# Altium footprint library FootprintLib.PcbLib: 19 footprints (part 1 of 2)
Each footprint in its own frame and in the unit in brackets; x right, y up, seen from the top. Pads: shape width x height; smd on the part's side, far side on the other; paste and mask are expansions set on the pad; w line width, h text height; cw(c..) or ccw(c..) is an arc to the next point about the centre after c.
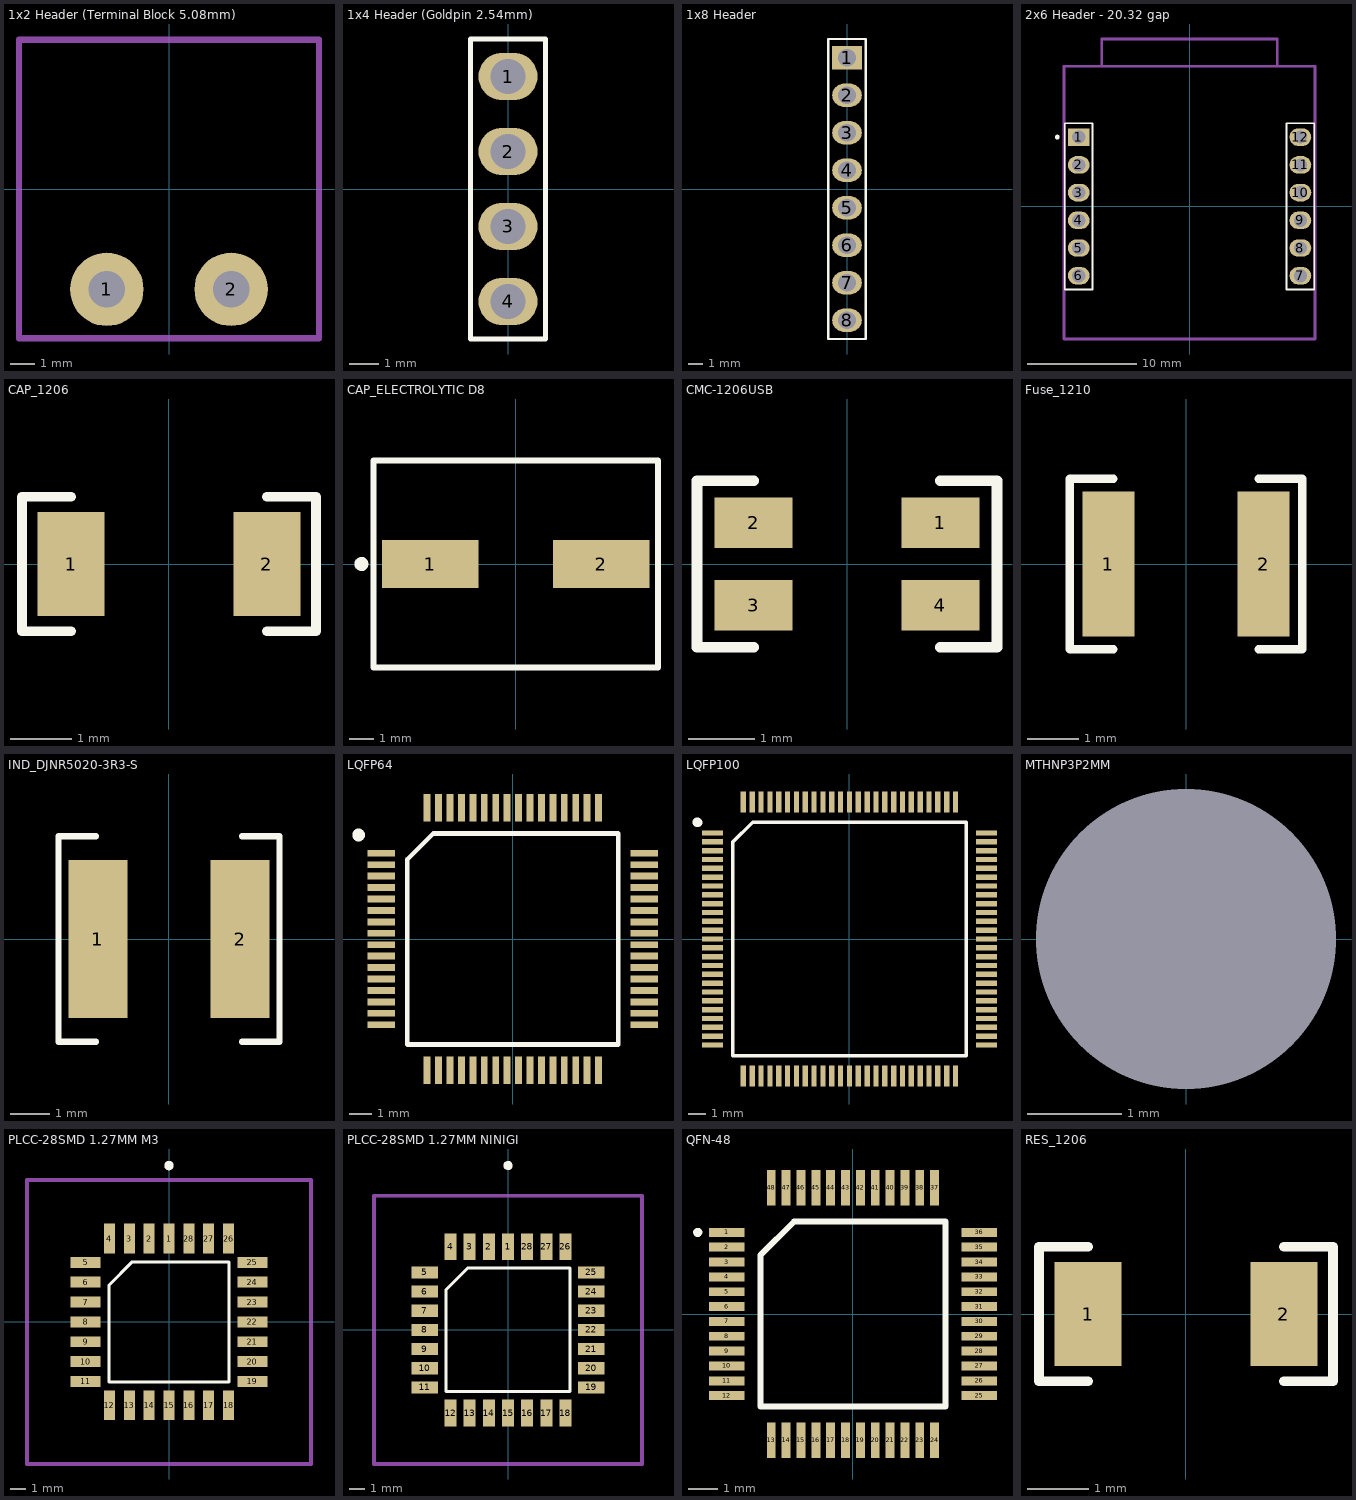
[diagram p0: the footprints below, top view; thin cyan lines are the x and y axes]

## 1x2 Header (Terminal Block 5.08mm) [mm] "1x2 Header (Terminal Block 5.08mm)"
pads (2):
  round 3 hole 1.5: 1(-2.54,-4.1) 2(2.54,-4.1)
Mechanical 1:
  lines w0.254: -6.13,-6.1 6.13,-6.1 6.13,6.1 -6.13,6.1 -6.13,-6.1
3D body "2059783_796638-2.SLDPRT": height 8.5, standoff -3.35, extent -5.99,-6 5.99,6

## 1x4 Header (Goldpin 2.54mm) [mm] "1x4 Header (Goldpin 2.54mm)"
pads (4):
  oval 2x1.6 hole 1.2: 1(0,3.81) 2(0,1.27) 3(0,-1.27) 4(0,-3.81)
Top Overlay:
  lines w0.16: -1.27,-5.08 -1.27,5.08 1.27,5.08 1.27,-5.08 -1.27,-5.08
3D body "User Library-1x2 TH Pitch 2_54mm.SLDPRT": height 9.5, standoff -3.2, extent -1.27,-5.08 1.27,0
3D body "User Library-1x2 TH Pitch 2_54mm.SLDPRT": height 9.5, standoff -3.2, extent -1.27,0 1.27,5.08

## 1x8 Header [mm]
pads (8):
  rect 2x1.6 hole 1.2: 1(0,8.89)
  oval 2x1.6 hole 1.2: 2(0,6.35) 3(0,3.81) 4(0,1.27) 5(0,-1.27) 6(0,-3.81) 7(0,-6.35) 8(0,-8.89)
Top Overlay:
  lines w0.16: -1.27,-10.16 1.27,-10.16 1.27,10.16 -1.27,10.16 -1.27,-10.16
3D body "User Library-Pin header 1x8 pinos reto pitch 2_54.SLDPRT": height 9.5, standoff -3.2, extent -1.23,-10.25 1.31,10.07

## 2x6 Header - 20.32 gap [mm]
pads (12):
  rect 2x1.6 hole 1.2: 1(-10.16,6.35)
  oval 2x1.6 hole 1.2: 2(-10.16,3.81) 3(-10.16,1.27) 4(-10.16,-1.27) 5(-10.16,-3.81) 6(-10.16,-6.35) 7(10.16,-6.35) 8(10.16,-3.81) 9(10.16,-1.27) 10(10.16,1.27) 11(10.16,3.81) 12(10.16,6.35)
Top Overlay:
  circle w0.4: c-12.125,6.35 r0.025
  lines w0.16: -11.43,-7.62 -11.43,7.62 -8.89,7.62 -8.89,-7.62 -11.43,-7.62 ; 8.89,-7.62 8.89,7.62 11.43,7.62 11.43,-7.62 8.89,-7.62
Mechanical 2:
  lines w0.254: -8.05,12.85 -8.05,15.35 8.05,15.35 8.05,12.85 ; -11.5,-12.15 11.5,-12.15 11.5,12.85 -11.5,12.85 -11.5,-12.15
3D body "WIZ820IO--3DModel-STEP-56544.STEP": height 19.61, standoff -6.1, extent -11.5,-12.15 11.5,15.35
3D body: height 0.25, standoff 0, extent 8.83,-7.9 11.37,7.84
3D body "User Library-Header_Fem_1X6.SLDPRT": height 8.5, standoff -3.2, extent -11.37,-7.9 -8.83,7.84

## CAP_1206 [mm]
pads (2):
  rect 1.1x1.7 smd: 1(-1.6,0) 2(1.6,0)
Top Overlay:
  lines w0.16: -1.6,-1.1 -2.4,-1.1 -2.4,1.1 -1.6,1.1 ; 1.6,-1.1 2.4,-1.1 2.4,1.1 1.6,1.1
3D body "CircuitWorks-CAPACITOR 1206.SLDPRT": height 1.63, standoff -0.03, extent -1.6,-0.78 1.6,0.78

## CAP_ELECTROLYTIC D8 [mm]
pads (2):
  rect 4x2 smd: 1(-3.55,0) 2(3.55,0)
Top Overlay:
  circle w0.3: c-6.4,0 r0.141
  lines w0.254: -5.9,-4.3 -5.9,4.3 5.9,4.3 5.9,-4.3 -5.9,-4.3
3D body "User Library-SMD 8x10.SLDPRT": height 8.5, standoff 0, extent -4.85,-4.15 4.85,4.15

## CMC-1206USB [mm]
pads (4):
  rect 1.17x0.76 smd: 1(1.4,0.62) 2(-1.4,0.62) 3(-1.4,-0.62) 4(1.4,-0.62)
Top Overlay:
  lines w0.16: -1.4,-1.25 -2.25,-1.25 -2.25,1.25 -1.4,1.25 ; 1.4,-1.25 2.25,-1.25 2.25,1.25 1.4,1.25
3D body "Coilcraft-1206USB.SLDPRT": height 1.93, standoff 0, extent -1.66,-0.86 1.66,0.86

## Fuse_1210 [mm] "Fuse 0ZCH0050FF2G 500mA 16V"
pads (2):
  rect 1x2.8 smd: 1(-1.5,0) 2(1.5,0)
Top Overlay:
  lines w0.16: -1.4,-1.65 -1.625,-1.65 -2.075,-1.65 -2.25,-1.65 -2.25,1.65 -1.4,1.65 ; 1.4,-1.65 2.25,-1.65 2.25,1.65 2.075,1.65 1.625,1.65 1.4,1.65
3D body "User Library-0ZCH0005FF2E.SLDPRT": height 0.71, standoff 0.01, extent -1.7,-1.3 1.7,1.3

## IND_DJNR5020-3R3-S [mm]
pads (2):
  rect 1.5x4 smd: 1(-1.8,0) 2(1.8,0)
Top Overlay:
  lines w0.16: -1.85,-2.6 -2.8,-2.6 -2.8,0 -2.8,2.6 -1.85,2.6 ; 1.85,-2.6 2.8,-2.6 2.8,0 2.8,2.6 1.85,2.6
3D body "User Library-CDRH4D28.SLDPRT": height 2.9, standoff -0.01, extent -2.45,-2.45 2.45,2.45

## LQFP64 [mm]
pads (64):
  rect 1.2x0.3 smd mask+0.05: 1(-5.75,3.75) 2(-5.75,3.25) 3(-5.75,2.75) 4(-5.75,2.25) 5(-5.75,1.75) 6(-5.75,1.25) 7(-5.75,0.75) 8(-5.75,0.25) 9(-5.75,-0.25) 10(-5.75,-0.75) 11(-5.75,-1.25) 12(-5.75,-1.75) 13(-5.75,-2.25) 14(-5.75,-2.75) 15(-5.75,-3.25) 16(-5.75,-3.75) 33(5.75,-3.75) 34(5.75,-3.25) 35(5.75,-2.75) 36(5.75,-2.25) 37(5.75,-1.75) 38(5.75,-1.25) 39(5.75,-0.75) 40(5.75,-0.25) 41(5.75,0.25) 42(5.75,0.75) 43(5.75,1.25) 44(5.75,1.75) 45(5.75,2.25) 46(5.75,2.75) 47(5.75,3.25) 48(5.75,3.75)
  rect 0.3x1.2 smd mask+0.05: 17(-3.75,-5.75) 18(-3.25,-5.75) 19(-2.75,-5.75) 20(-2.25,-5.75) 21(-1.75,-5.75) 22(-1.25,-5.75) 23(-0.75,-5.75) 24(-0.25,-5.75) 25(0.25,-5.75) 26(0.75,-5.75) 27(1.25,-5.75) 28(1.75,-5.75) 29(2.25,-5.75) 30(2.75,-5.75) 31(3.25,-5.75) 32(3.75,-5.75) 49(3.75,5.75) 50(3.25,5.75) 51(2.75,5.75) 52(2.25,5.75) 53(1.75,5.75) 54(1.25,5.75) 55(0.75,5.75) 56(0.25,5.75) 57(-0.25,5.75) 58(-0.75,5.75) 59(-1.25,5.75) 60(-1.75,5.75) 61(-2.25,5.75) 62(-2.75,5.75) 63(-3.25,5.75) 64(-3.75,5.75)
Top Overlay:
  circle w0.5: c-6.75,4.55 r0.025
  lines w0.2: -4.615,-4.615 4.615,-4.615 4.615,4.615 -3.48,4.615 -4.615,3.48 -4.615,-4.615
3D body "User Library-STM32Fxxx -LQFP64 10mm x 10mm.SLDPRT": height 1.6, standoff 0.01, extent -5.999,-5.999 5.999,5.999

## LQFP100 [mm] "LQFP100"
pads (100):
  rect 1.2x0.3 smd mask+0.05: 1(-7.75,6) 2(-7.75,5.5) 3(-7.75,5) 4(-7.75,4.5) 5(-7.75,4) 6(-7.75,3.5) 7(-7.75,3) 8(-7.75,2.5) 9(-7.75,2) 10(-7.75,1.5) 11(-7.75,1) 12(-7.75,0.5) 13(-7.75,0) 14(-7.75,-0.5) 15(-7.75,-1) 16(-7.75,-1.5) 17(-7.75,-2) 18(-7.75,-2.5) 19(-7.75,-3) 20(-7.75,-3.5) 21(-7.75,-4) 22(-7.75,-4.5) 23(-7.75,-5) 24(-7.75,-5.5) 25(-7.75,-6) 51(7.75,-6) 52(7.75,-5.5) 53(7.75,-5) 54(7.75,-4.5) 55(7.75,-4) 56(7.75,-3.5) 57(7.75,-3) 58(7.75,-2.5) 59(7.75,-2) 60(7.75,-1.5) 61(7.75,-1) 62(7.75,-0.5) 63(7.75,0) 64(7.75,0.5) 65(7.75,1) 66(7.75,1.5) 67(7.75,2) 68(7.75,2.5) 69(7.75,3) 70(7.75,3.5) 71(7.75,4) 72(7.75,4.5) 73(7.75,5) 74(7.75,5.5) 75(7.75,6)
  rect 0.3x1.2 smd mask+0.05: 26(-6,-7.75) 27(-5.5,-7.75) 28(-5,-7.75) 29(-4.5,-7.75) 30(-4,-7.75) 31(-3.5,-7.75) 32(-3,-7.75) 33(-2.5,-7.75) 34(-2,-7.75) 35(-1.5,-7.75) 36(-1,-7.75) 37(-0.5,-7.75) 38(0,-7.75) 39(0.5,-7.75) 40(1,-7.75) 41(1.5,-7.75) 42(2,-7.75) 43(2.5,-7.75) 44(3,-7.75) 45(3.5,-7.75) 46(4,-7.75) 47(4.5,-7.75) 48(5,-7.75) 49(5.5,-7.75) 50(6,-7.75) 76(6,7.75) 77(5.5,7.75) 78(5,7.75) 79(4.5,7.75) 80(4,7.75) 81(3.5,7.75) 82(3,7.75) 83(2.5,7.75) 84(2,7.75) 85(1.5,7.75) 86(1,7.75) 87(0.5,7.75) 88(0,7.75) 89(-0.5,7.75) 90(-1,7.75) 91(-1.5,7.75) 92(-2,7.75) 93(-2.5,7.75) 94(-3,7.75) 95(-3.5,7.75) 96(-4,7.75) 97(-4.5,7.75) 98(-5,7.75) 99(-5.5,7.75) 100(-6,7.75)
Top Overlay:
  circle w0.5: c-8.6,6.6 r0.025
  lines w0.2: -6.615,-6.615 6.615,-6.615 6.615,6.615 -5.48,6.615 -6.615,5.48 -6.615,-6.615
3D body "User Library-LQFP100_05.SLDPRT": height 1.6, standoff 0, extent -8,-8 8,8

## MTHNP3P2MM [mm] "Mounting Hole Non-Plated, 3.2mm hole"
pads (1):
  round 1 hole 3.2: ""(0,0)

## PLCC-28SMD 1.27MM M3 [mm] "PLCC-28SMD 1.27MM M3"
pads (28):
  rect 0.7x1.91 smd: 1(0,5.33) 2(-1.27,5.33) 3(-2.54,5.33) 4(-3.81,5.33) 12(-3.81,-5.33) 13(-2.54,-5.33) 14(-1.27,-5.33) 15(0,-5.33) 16(1.27,-5.33) 17(2.54,-5.33) 18(3.81,-5.33) 26(3.81,5.33) 27(2.54,5.33) 28(1.27,5.33)
  rect 1.91x0.7 smd: 5(-5.33,3.81) 6(-5.33,2.54) 7(-5.33,1.27) 8(-5.33,0) 9(-5.33,-1.27) 10(-5.33,-2.54) 11(-5.33,-3.81) 19(5.33,-3.81) 20(5.33,-2.54) 21(5.33,-1.27) 22(5.33,0) 23(5.33,1.27) 24(5.33,2.54) 25(5.33,3.81)
Top Overlay:
  circle w0.4: c0,10 r0.1
  lines w0.2: -3.84,-3.84 -3.84,2.35 -2.35,3.84 3.84,3.84 3.84,-3.84 -3.84,-3.84
Mechanical 2:
  lines w0.254: -9.09,-9.09 -9.09,9.09 9.09,9.09 9.09,-9.09 -9.09,-9.09
3D body "PLCC-28SMD.SLDPRT": height 4.6, standoff -1.05, extent -8.67,-8.67 8.67,8.67

## PLCC-28SMD 1.27MM NINIGI [mm] "PLCC-28SMD 1.27MM NINIGI"
pads (28):
  rect 0.8x1.76 smd: 1(0,5.51) 2(-1.27,5.51) 3(-2.54,5.51) 4(-3.81,5.51) 12(-3.81,-5.51) 13(-2.54,-5.51) 14(-1.27,-5.51) 15(0,-5.51) 16(1.27,-5.51) 17(2.54,-5.51) 18(3.81,-5.51) 26(3.81,5.51) 27(2.54,5.51) 28(1.27,5.51)
  rect 1.76x0.8 smd: 5(-5.51,3.81) 6(-5.51,2.54) 7(-5.51,1.27) 8(-5.51,0) 9(-5.51,-1.27) 10(-5.51,-2.54) 11(-5.51,-3.81) 19(5.51,-3.81) 20(5.51,-2.54) 21(5.51,-1.27) 22(5.51,0) 23(5.51,1.27) 24(5.51,2.54) 25(5.51,3.81)
Top Overlay:
  circle w0.4: c0,10.9 r0.1
  lines w0.2: -4.095,-4.095 -4.095,2.68 -2.68,4.095 4.095,4.095 4.095,-4.095 -4.095,-4.095
Mechanical 2:
  lines w0.254: -8.89,-8.89 8.89,-8.89 8.89,8.89 -8.89,8.89 -8.89,-8.89
3D body "540-88-028-17-400.SLDPRT": height 4.6, standoff -1.05, extent -8.67,-8.67 8.67,8.67

## QFN-48 [mm]
pads (48):
  rect 1.2x0.3 smd mask+0.05: 1(-4.25,2.75) 2(-4.25,2.25) 3(-4.25,1.75) 4(-4.25,1.25) 5(-4.25,0.75) 6(-4.25,0.25) 7(-4.25,-0.25) 8(-4.25,-0.75) 9(-4.25,-1.25) 10(-4.25,-1.75) 11(-4.25,-2.25) 12(-4.25,-2.75) 25(4.25,-2.75) 26(4.25,-2.25) 27(4.25,-1.75) 28(4.25,-1.25) 29(4.25,-0.75) 30(4.25,-0.25) 31(4.25,0.25) 32(4.25,0.75) 33(4.25,1.25) 34(4.25,1.75) 35(4.25,2.25) 36(4.25,2.75)
  rect 0.3x1.2 smd mask+0.05: 13(-2.75,-4.25) 14(-2.25,-4.25) 15(-1.75,-4.25) 16(-1.25,-4.25) 17(-0.75,-4.25) 18(-0.25,-4.25) 19(0.25,-4.25) 20(0.75,-4.25) 21(1.25,-4.25) 22(1.75,-4.25) 23(2.25,-4.25) 24(2.75,-4.25) 37(2.75,4.25) 38(2.25,4.25) 39(1.75,4.25) 40(1.25,4.25) 41(0.75,4.25) 42(0.25,4.25) 43(-0.25,4.25) 44(-0.75,4.25) 45(-1.25,4.25) 46(-1.75,4.25) 47(-2.25,4.25) 48(-2.75,4.25)
Top Overlay:
  circle w0.254: c-5.225,2.75 r0.025
  lines w0.2: -3.115,-3.115 -3.115,1.98 -1.98,3.115 3.115,3.115 3.115,-3.115 -3.115,-3.115
3D body "User Library-LQFP48-3.SLDPRT": height 1.6, standoff 0, extent -4.5,-4.5 4.5,4.5

## RES_1206 [mm]
pads (2):
  rect 1.1x1.7 smd: 1(-1.6,0) 2(1.6,0)
Top Overlay:
  lines w0.16: -1.6,-1.1 -2.4,-1.1 -2.4,1.1 -1.6,1.1 ; 1.6,-1.1 2.4,-1.1 2.4,1.1 1.6,1.1
3D body "CircuitWorks-RESISTOR 1206.SLDPRT": height 0.53, standoff -0.03, extent -1.6,-0.83 1.6,0.83